# Altium footprint library ZYF_Common.PcbLib: 64 footprints (part 3 of 4)
Each footprint in its own frame and in the unit in brackets; x right, y up, seen from the top. Pads: shape width x height; smd on the part's side, far side on the other; paste and mask are expansions set on the pad; w line width, h text height; cw(c..) or ccw(c..) is an arc to the next point about the centre after c.
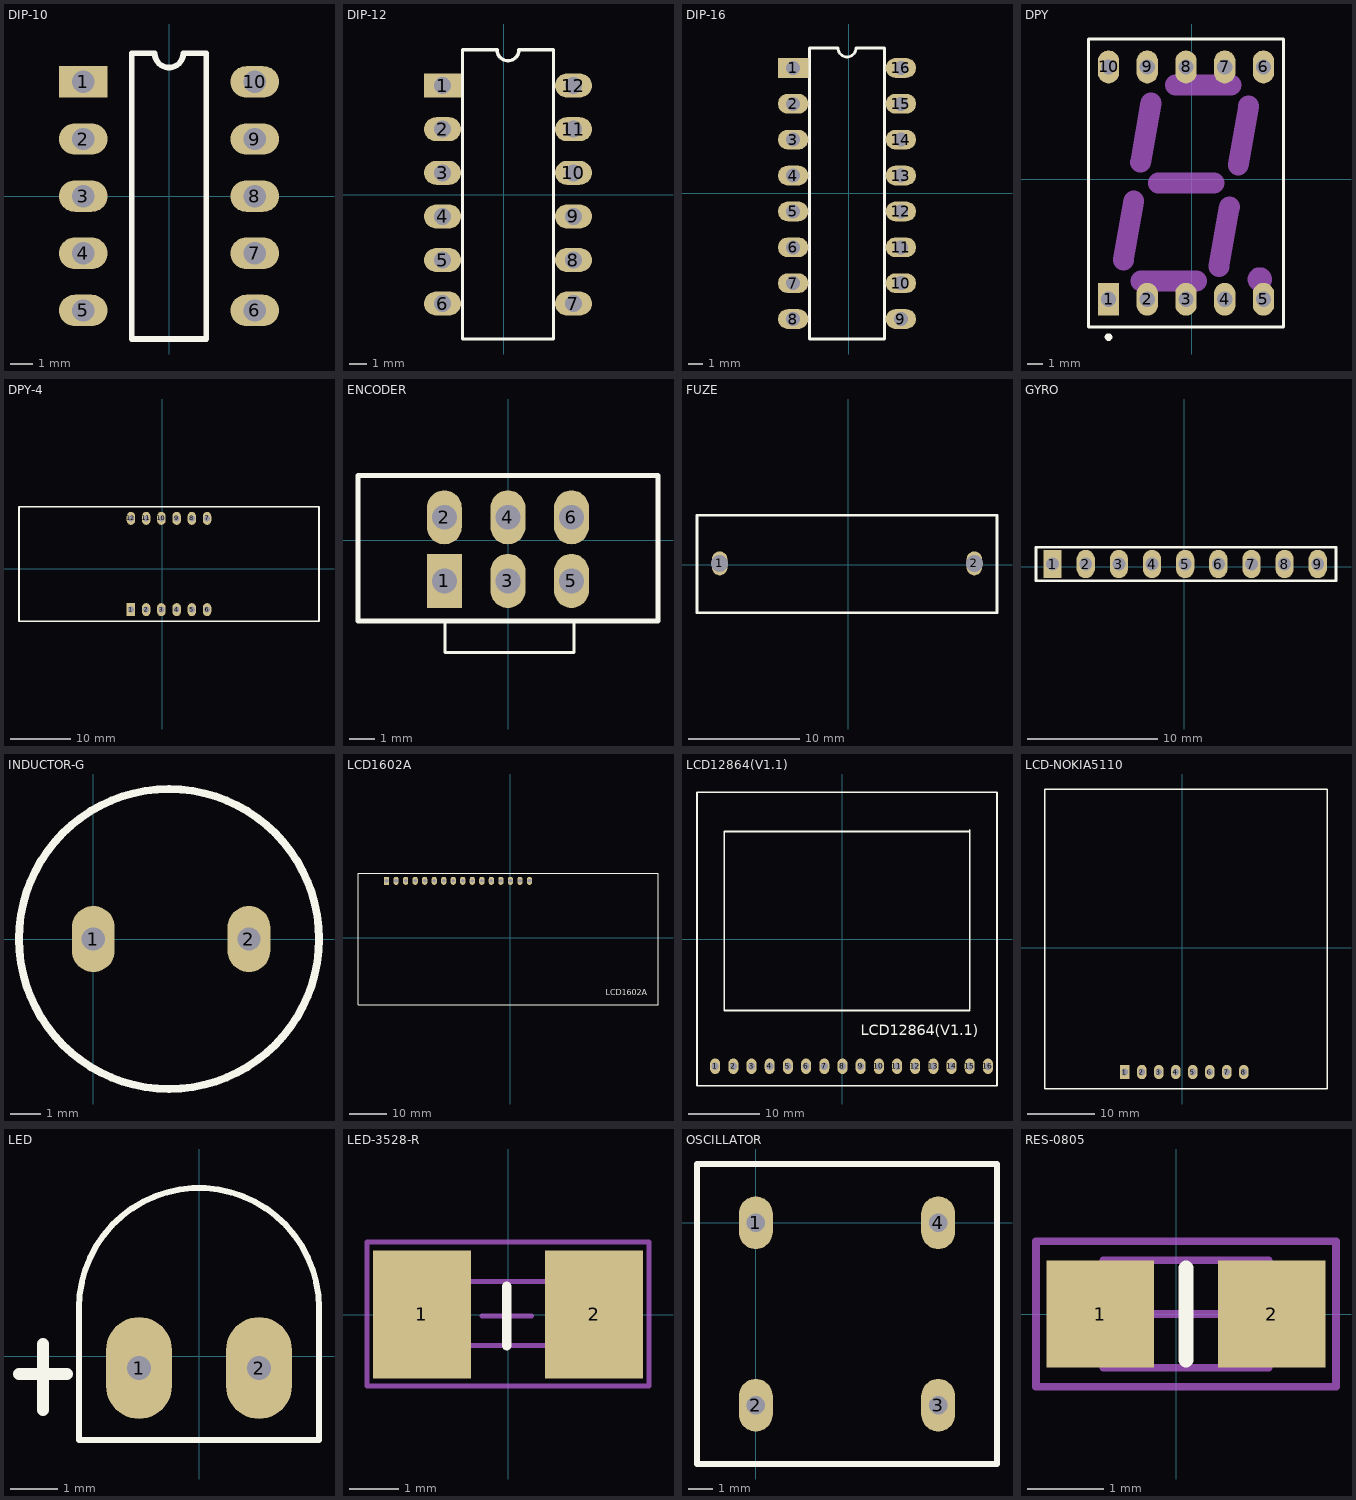
[diagram p2: the footprints below, top view; thin cyan lines are the x and y axes]

## DIP-10 [mil]
pads (10):
  rect 85x55 hole 39: 1(-150,200)
  oval 85x55 hole 39: 2(-150,100) 3(-150,0) 4(-150,-100) 5(-150,-200) 6(150,-200) 7(150,-100) 8(150,0) 9(150,100) 10(150,200)
Top Overlay:
  lines w10: -65,-250 65,-250 65,250 25,250 cw(c0,250) -25,250 -65,250 -65,-250
3D body: height 275.59, standoff -145.67, extent -195.77,-268.69 194,270.69

## DIP-12 [mil]
pads (12):
  rect 85x55 hole 39: 1(-140,250)
  oval 85x55 hole 39: 2(-140,150) 3(-140,50) 4(-140,-50) 5(-140,-150) 6(-140,-250) 7(160,-250) 8(160,-150) 9(160,-50) 10(160,50) 11(160,150) 12(160,250)
Top Overlay:
  lines w7.87: -94.33,-331.1 -94.33,331.89 -15,331.89 ccw(c10,331.89) 35,331.89 114.33,331.89 114.33,-331.1 -94.33,-331.1
3D body: height 164.96, standoff -150, extent -146.56,-342.1 176.56,339

## DIP-16 [mil]
pads (16):
  rect 85x55 hole 39: 1(-155,350)
  oval 85x55 hole 39: 2(-155,250) 3(-155,150) 4(-155,50) 5(-155,-50) 6(-155,-150) 7(-155,-250) 8(-155,-350) 9(145,-350) 10(145,-250) 11(145,-150) 12(145,-50) 13(145,50) 14(145,150) 15(145,250) 16(145,350)
Top Overlay:
  lines w7.87: -109.33,-405.51 -109.33,405.51 -30,405.51 ccw(c-5,405.51) 20,405.51 99.33,405.51 99.33,-405.51 -109.33,-405.51
3D body: height 204.33, standoff -150, extent -169.56,-447.94 153.55,433.95

## DPY [mil]
pads (10):
  rect 55x85 hole 39: 1(-215,-310)
  oval 55x85 hole 39: 2(-115,-310) 3(-15,-310) 4(85,-310) 5(185,-310) 6(185,290) 7(85,290) 8(-15,290) 9(-115,290) 10(-215,290)
Top Overlay:
  circle w9.84: c-215,-407.64 r4.92
  lines w7.87: -266.97,-382.05 236.97,-382.05 236.97,362.05 -266.97,362.05 -266.97,-382.05
Mechanical 1:
  circle w39.37: c175.63,-258.66 r11.65
  lines w53.94: -176.73,-208.96 -149.86,-56.07 ; -132.1,43.87 -105.29,196.91 ; -131.47,-263.1 12.24,-262.98 ; -86.7,-10 56.96,-10 ; -42.12,242.95 101.54,242.95 ; 70,-225 96.99,-72.04 ; 119.92,36.04 146.83,189.13

## DPY-4 [mil]
pads (12):
  rect 55x85 hole 39: 1(-205,-270)
  oval 55x85 hole 39: 2(-105,-270) 3(-5,-270) 4(95,-270) 5(195,-270) 6(295,-270) 7(295,330) 8(195,330) 9(95,330) 10(-5,330) 11(-105,330) 12(-205,330)
Top Overlay:
  lines w10: -940,-345 -940,405 1030,405 1030,-345 -940,-345

## ENCODER [mil]
pads (6):
  rect 55x85 hole 39: 1(-100.13,-63.57)
  oval 55x85 hole 39: 2(-100.13,36.43) 3(-0.13,-63.57) 4(-0.13,36.43) 5(99.87,-63.57) 6(99.87,36.43)
Top Overlay:
  lines w5: -99,-127 -99,-176 104,-176 104,-127
  lines w7.87: -99,-127 236,-127 236,102 -236,102 -236,-127 149.87,-127
3D body: height 322.83, standoff -118.11, extent -150.12,-115.3 149.87,-16.94
3D body: height 322.83, standoff -118.11, extent -150.12,-16.94 149.87,81.43

## FUZE [mil]
pads (2):
  oval 55x85 hole 60: 1(-455,5) 2(445,5)
Top Overlay:
  lines w10: -535,-170 525,-170 525,175 -535,175 -535,-170

## GYRO [mil]
pads (9):
  rect 55x85 hole 39: 1(-397,9)
  oval 55x85 hole 39: 2(-297,9) 3(-197,9) 4(-97,9) 5(3,9) 6(103,9) 7(203,9) 8(303,9) 9(403,9)
Top Overlay:
  lines w7.87: -447,-41 -447,59 -372,59 458,59 458,-41 -447,-41
3D body: height 322.83, standoff -118.11, extent -42,-39.36 458,59
3D body: height 322.83, standoff -118.11, extent -442,-39.36 -42,59

## INDUCTOR-G [mil]
pads (2):
  oval 55x85 hole 30: 1(0,0) 2(200,0)
Top Overlay:
  circle w10: c97.27,0 r192.73
3D body: height 440.94, standoff -196.85, extent -64.38,-162.38 262.39,164.4

## LCD1602A [mil]
pads (16):
  rect 55x85 hole 39: 1(-1300,600)
  oval 55x85 hole 39: 2(-1200,600) 3(-1100,600) 4(-1000,600) 5(-900,600) 6(-800,600) 7(-700,600) 8(-600,600) 9(-500,600) 10(-400,600) 11(-300,600) 12(-200,600) 13(-100,600) 14(0,600) 15(100,600) 16(200,600)
Top Overlay:
  lines w10: -1600,-700 -1600,677.95 1549.61,677.95 1549.61,-700 -1600,-700
  text "LCD1602A" at 1000,-600 h60

## LCD12864(V1.1) [mil]
pads (16):
  oval 55x85 hole 39: 1(-700,-700) 2(-600,-700) 3(-500,-700) 4(-400,-700) 5(-300,-700) 6(-200,-700) 7(-100,-700) 8(0,-700) 9(100,-700) 10(200,-700) 11(300,-700) 12(400,-700) 13(500,-700) 14(600,-700) 15(700,-700) 16(800,-700)
Top Overlay:
  lines w10: 700,-393.7 -650,-393.7 -650,590.55 700,590.55 ; 700,-384.25 700,600 ; -800,-807.09 850,-807.09 850,807.09 -800,807.09 -800,-807.09
  text "LCD12864(V1.1)" at 100,-550 h100

## LCD-NOKIA5110 [mil]
pads (8):
  rect 55x85 hole 39: 1(-337,-731)
  oval 55x85 hole 39: 2(-237,-731) 3(-137,-731) 4(-37,-731) 5(63,-731) 6(163,-731) 7(263,-731) 8(363,-731)
Top Overlay:
  lines w7.87: -807,-831 853,-831 853,934 -807,934 -807,-831
3D body: height 334.65, standoff -125.98, extent -392.92,-784.43 416.92,-686

## LED [mil]
pads (2):
  oval 55x85 hole 20: 1(-50,-10) 2(50,-10)
Top Overlay:
  lines w5: -100,-70 -100,40 cw(c0,40) 100,40 100,-70 -100,-70
  lines w10: -150,-15 -110,-15 ; -130,-45 -130,10
3D body: height 248.11, standoff -366.06, extent -115.14,-127 117.14,105.28

## LED-3528-R [mm]
pads (2):
  rect 2x2.6 smd: 1(-1.75,0.003) 2(1.75,0.003)
Top Overlay:
  lines w0.2: -0.025,-0.625 -0.025,0.575
Mechanical 13:
  lines w0.1: -1.1,-0.625 -1.1,0.675 1.05,0.675 1.05,-0.625 -1.1,-0.625
Mechanical 15:
  lines w0.1: -0.525,-0.025 0.475,-0.025 ; -0.025,-0.525 -0.025,0.475 ; -2.87,-1.448 2.87,-1.448 2.87,1.473 -2.87,1.473 -2.87,-1.448
3D body: height 1.75, standoff -0.05, extent -1.75,-1.397 1.75,1.403

## OSCILLATOR [mil]
pads (4):
  oval 55x85 hole 30: 1(0,0) 2(0,-295) 3(295,-295) 4(295,0)
Top Overlay:
  lines w10: -95,-390 390,-390 390,95 -95,95 -95,-390

## RES-0805 [mm]
pads (2):
  rect 1.4x1.4 smd: 1(-0.991,0) 2(1.245,0)
Top Overlay:
  lines w0.2: 0.127,-0.6 0.127,0.6
Mechanical 13:
  lines w0.1: -0.948,-0.7 -0.948,0.7 1.202,0.7 1.202,-0.7 -0.948,-0.7
Mechanical 15:
  lines w0.1: -0.373,0 0.627,0 ; 0.127,-0.5 0.127,0.5 ; -1.829,-0.95 2.083,-0.95 2.083,0.95 -1.829,0.95 -1.829,-0.95
3D body: height 0.49, standoff -0.04, extent -1.363,-0.702 1.637,0.698